# Altium footprint library Blue Pill.PcbLib: 1 footprints
Each footprint in its own frame and in the unit in brackets; x right, y up, seen from the top. Pads: shape width x height; smd on the part's side, far side on the other; paste and mask are expansions set on the pad; w line width, h text height; cw(c..) or ccw(c..) is an arc to the next point about the centre after c.
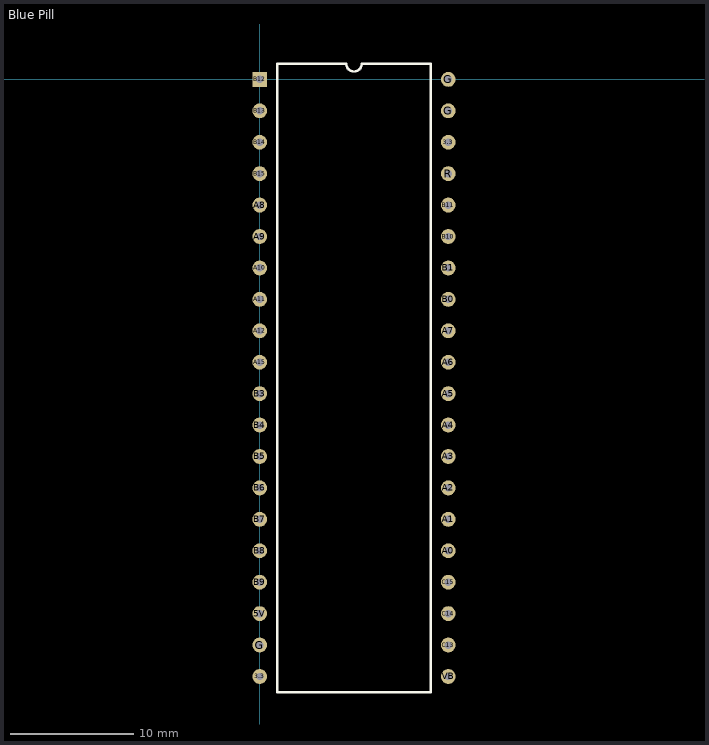
[diagram p0: the footprint, top view; thin cyan lines are the x and y axes]

## Blue Pill [mm]
pads (40):
  round 1.2 hole 0.6: 3.3(0,-48.26) 3.3(15.24,-5.08) 5V(0,-43.18) A0(15.24,-38.1) A1(15.24,-35.56) A2(15.24,-33.02) A3(15.24,-30.48) A4(15.24,-27.94) A5(15.24,-25.4) A6(15.24,-22.86) A7(15.24,-20.32) A8(0,-10.16) A9(0,-12.7) A10(0,-15.24) A11(0,-17.78) A12(0,-20.32) A15(0,-22.86) B0(15.24,-17.78) B1(15.24,-15.24) B3(0,-25.4) B4(0,-27.94) B5(0,-30.48) B6(0,-33.02) B7(0,-35.56) B8(0,-38.1) B9(0,-40.64) B10(15.24,-12.7) B11(15.24,-10.16) B13(0,-2.54) B14(0,-5.08) B15(0,-7.62) C13(15.24,-45.72) C14(15.24,-43.18) C15(15.24,-40.64) G(0,-45.72) G(15.24,-2.54) G(15.24,0) R(15.24,-7.62) VB(15.24,-48.26)
  rect 1.2x1.2 hole 0.6: B12(0,0)
Top Overlay:
  lines w0.2: 1.435,-49.53 1.435,1.27 6.985,1.27 ccw(c7.62,1.27) 8.255,1.27 13.805,1.27 13.805,-49.53 1.435,-49.53
3D body "BluePill.step": height 11.1, standoff -1.4, extent -3.68,-50.638 18.92,2.362